# Altium footprint library SOCKET_DIPSMD.PcbLib: 18 footprints (part 2 of 2)
Each footprint in its own frame and in the unit in brackets; x right, y up, seen from the top. Pads: shape width x height; smd on the part's side, far side on the other; paste and mask are expansions set on the pad; w line width, h text height; cw(c..) or ccw(c..) is an arc to the next point about the centre after c.
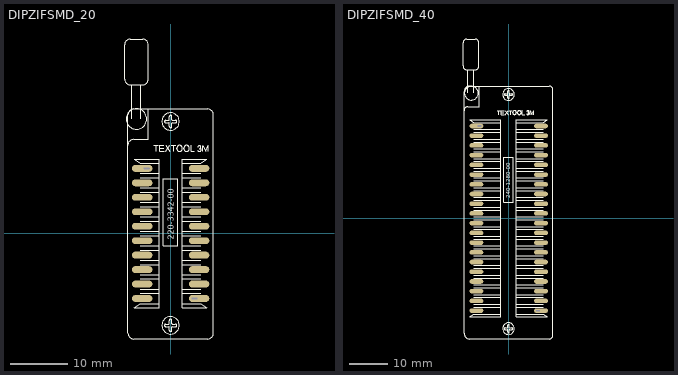
[diagram p1: the footprints below, top view; thin cyan lines are the x and y axes]

## DIPZIFSMD_20 [mm] "SOCKET ZIF DIP 20"
pads (22):
  oval 3.6x1.2 smd: 1(-5,11.43) 2(-5,8.89) 3(-5,6.35) 4(-5,3.81) 5(-5,1.27) 6(-5,-1.27) 7(-5,-3.81) 8(-5,-6.35) 9(-5,-8.89) 10(-5,-11.43) 11(5,-11.43) 12(5,-8.89) 13(5,-6.35) 14(5,-3.81) 15(5,-1.27) 16(5,1.27) 17(5,3.81) 18(5,6.35) 19(5,8.89) 20(5,11.43)
  oval 1.2x0.5 / inner round 0 / far side round 0 hole 0.3 slot 1 at 0 deg: 1(-4.2,11.43) 11(4.2,-11.43)
TopOverlay:
  drawing of 152 lines, arcs and shapes, not listed
  text "220-3342-00" at 0.508,-1.143 h1.02

## DIPZIFSMD_40 [mm] "SOCKET ZIF DIP, pitch 2.54mm, 600mil Width, IC ZIF SOCKET, 240-6I82 3M"
pads (42):
  oval 3.6x1.2 smd: 1(-8.4,24.13) 2(-8.4,21.59) 3(-8.4,19.05) 4(-8.4,16.51) 5(-8.4,13.97) 6(-8.4,11.43) 7(-8.4,8.89) 8(-8.4,6.35) 9(-8.4,3.81) 10(-8.4,1.27) 11(-8.4,-1.27) 12(-8.4,-3.81) 13(-8.4,-6.35) 14(-8.4,-8.89) 15(-8.4,-11.43) 16(-8.4,-13.97) 17(-8.4,-16.51) 18(-8.4,-19.05) 19(-8.4,-21.59) 20(-8.4,-24.13) 21(8.5,-24.13) 22(8.5,-21.59) 23(8.5,-19.05) 24(8.5,-16.51) 25(8.5,-13.97) 26(8.5,-11.43) 27(8.5,-8.89) 28(8.5,-6.35) 29(8.5,-3.81) 30(8.5,-1.27) 31(8.5,1.27) 32(8.5,3.81) 33(8.5,6.35) 34(8.5,8.89) 35(8.5,11.43) 36(8.5,13.97) 37(8.5,16.51) 38(8.5,19.05) 39(8.5,21.59) 40(8.5,24.13)
  oval 1.2x0.5 / inner round 0 / far side round 0 hole 0.3 slot 1 at 0 deg: 1(-7.6,24.13) 21(7.7,-24.13)
TopOverlay:
  drawing of 192 lines, arcs and shapes, not listed
  text "240-1280-00" at 0.508,5.207 h1.02
3D body "Zif-Zip Socket.STEP": height 24.47, standoff -0.03, extent -12.975,-31.475 11.501,41.605